# Altium footprint library capacitors.PcbLib: 59 footprints (part 1 of 4)
Each footprint in its own frame and in the unit in brackets; x right, y up, seen from the top. Pads: shape width x height; smd on the part's side, far side on the other; paste and mask are expansions set on the pad; w line width, h text height; cw(c..) or ccw(c..) is an arc to the next point about the centre after c.
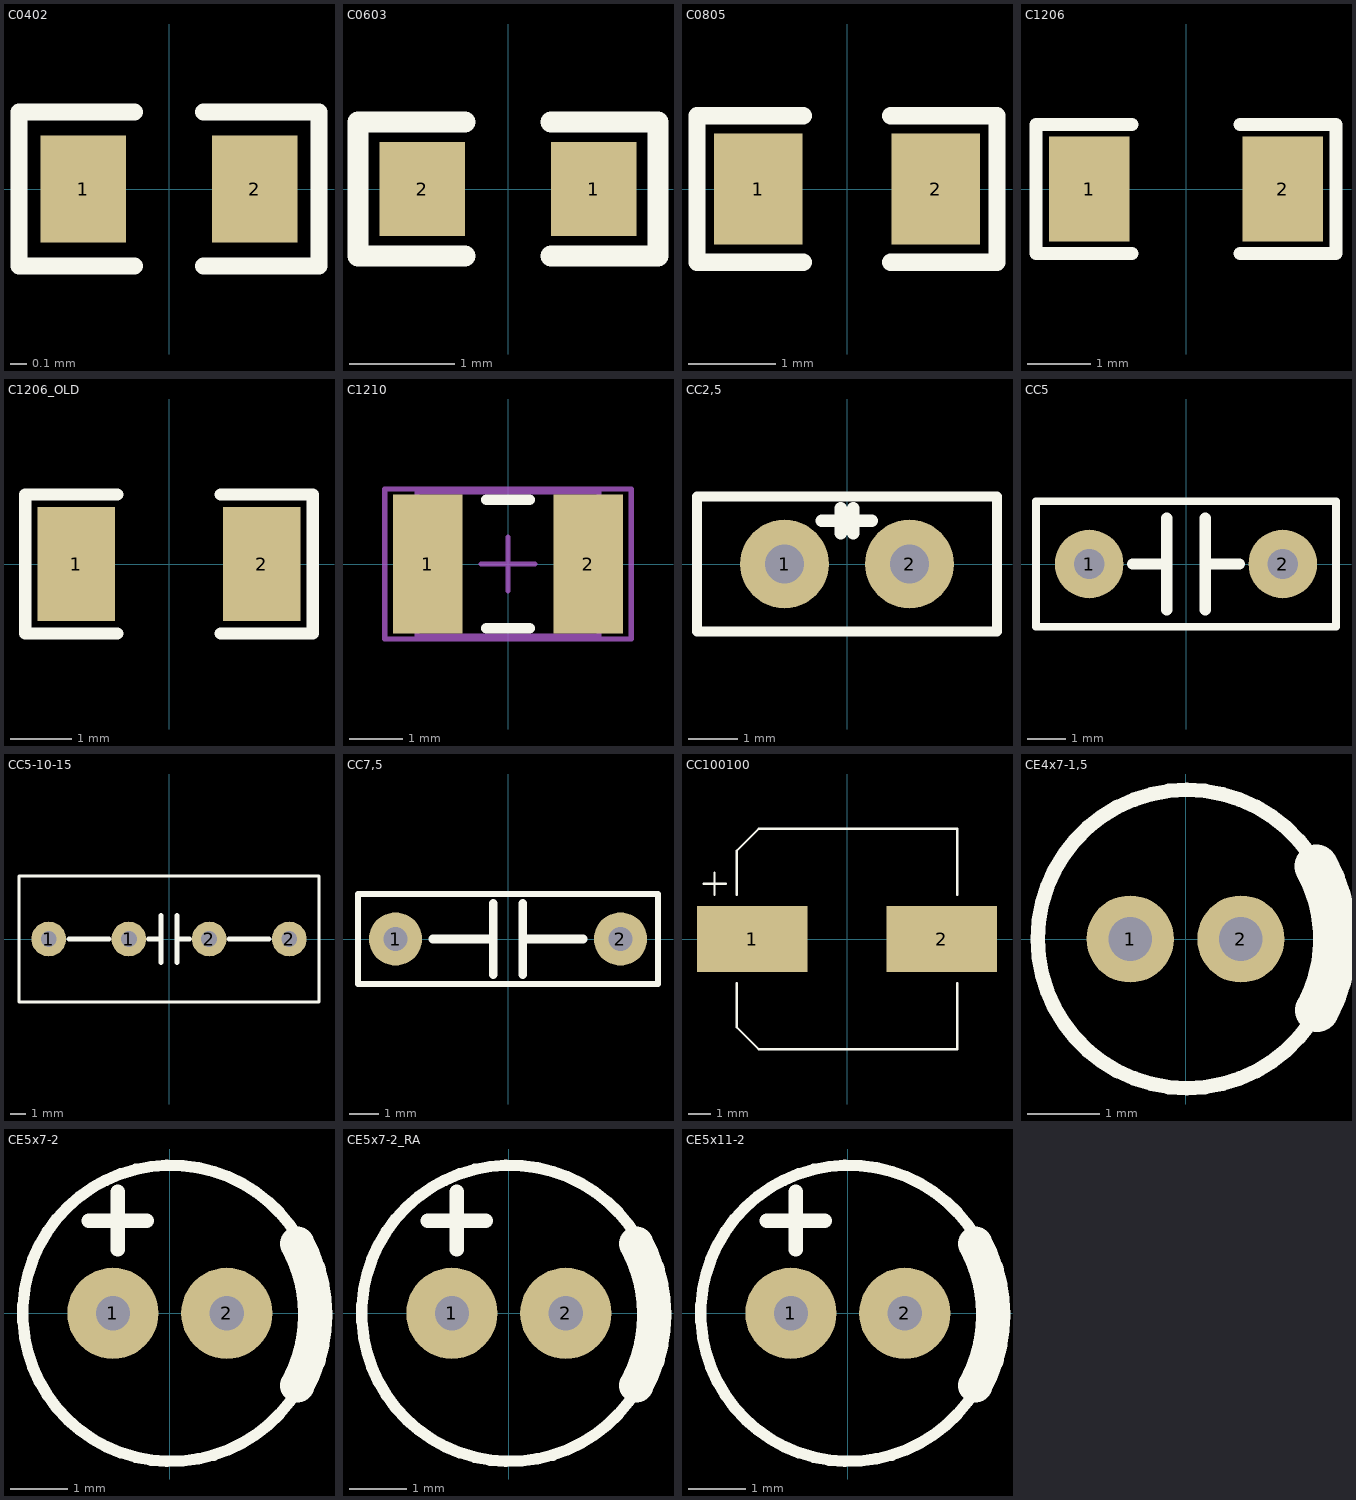
[diagram p0: the footprints below, top view; thin cyan lines are the x and y axes]

## C0402 [mil]
pads (2):
  rect 20x25 smd: 1(-20,0) 2(20,0)
Top Overlay:
  lines w3.94: -8,-18 -35,-18 -35,18 -8,18 ; 8,-18 35,-18 35,18 8,18
3D body "User Library-0402 SMD Capacitor.step": height 7.95, standoff 0, extent -19.68,-11.81 19.69,11.81

## C0603 [mil]
pads (2):
  rect 32x35 smd: 1(32,0) 2(-32,0)
Top Overlay:
  lines w7.87: -16,-25 -56,-25 -56,25 -16,25 ; 16,-25 56,-25 56,25 16,25
3D body "User Library-0603 SMD Capacitor.step": height 11.89, standoff 0, extent -31.49,-15.74 31.5,15.76

## C0805 [mil]
height 49.21
pads (2):
  rect 40x50 smd: 1(-40,0) 2(40,0)
Top Overlay:
  lines w7.87: -19.68,-33 -67.72,-33 -67.72,33 -19.68,33 ; 19.68,-33 67.72,-33 67.72,33 19.68,33
3D body "User Library-0805 SMD Capacitor.step": height 30.79, standoff 0, extent -39.36,-24.6 39.38,24.61

## C1206 [mil]
height 86.61
pads (2):
  rect 50x65 smd: 1(-60,0) 2(60,0)
Top Overlay:
  lines w7.87: -33.46,-40 -93,-40 -93,40 -33.46,40 ; 33.46,-40 92.91,-40 92.91,40 33.46,40
3D body "User Library-1206 SMD Capacitor.step": height 39.45, standoff 0, extent -62.99,-31.49 63,31.5

## C1206_OLD [mil]
height 86.61
pads (2):
  rect 50x74 smd: 1(-60,0) 2(60,0)
Top Overlay:
  lines w7.87: -33.46,-45 -93,-45 -93,45 -33.46,45 ; 33.46,-45 92.91,-45 92.91,45 33.46,45
3D body "User Library-1206 SMD Capacitor.step": height 39.45, standoff 0, extent -62.99,-31.49 63,31.5

## C1210 [mm] "Chip Capacitor, Body 3.2x2.5mm, IPC High Density"
height 1.3
pads (2):
  rect 1.3x2.6 smd: 1(-1.5,0) 2(1.5,0)
Top Overlay:
  lines w0.2: -0.4,-1.2 0.4,-1.2 ; -0.4,1.2 0.4,1.2
Mechanical 13:
  lines w0.1: -1.7,-1.35 -1.7,1.35 1.7,1.35 1.7,-1.35 -1.7,-1.35
Mechanical 15:
  lines w0.1: -0.5,0 0.5,0 ; 0,-0.5 0,0.5 ; -2.3,-1.4 -2.3,1.4 2.3,1.4 2.3,-1.4 -2.3,-1.4
3D body "User Library-CAPC3225X10.step": height 1, standoff 0, extent -1.6,-1.25 1.6,1.25

## C1812 [mm]
3D body "User Library-1812 SMD Capacitor.step": height 6.3, standoff 4.7, extent -2.692,-5.719 0.508,-1.219

## CC2,5 [mm]
pads (2):
  round 1.8 hole 0.8: 1(-1.27,0) 2(1.27,0)
Top Overlay:
  lines w0.2: -3.048,-1.372 3.048,-1.372 3.048,1.372 -3.048,1.372 -3.048,-1.372
  lines w0.254: -0.51,0.879 -0.256,0.879 ; -0.129,0.625 -0.129,1.133 ; 0.125,0.625 0.125,1.133 ; 0.125,0.879 0.379,0.879 0.506,0.879
3D body "SW3dPS-Cap 100n.STEP": height 6.22, standoff -1.7, extent -2.918,-0.848 2.921,0.848

## CC5 [mm]
height 5
pads (2):
  round 1.8 hole 0.8: 1(-2.54,0) 2(2.54,0)
Top Overlay:
  lines w0.2: -3.937,-1.651 -3.937,1.651 3.937,1.651 3.937,-1.651 -3.937,-1.651
  lines w0.3: -1.4,0 -0.5,0 ; -0.5,-1.2 -0.5,1.2 ; 0.5,-1.2 0.5,1.2 ; 0.5,0 1.4,0
3D body "SW3dPS-capacitor-radial.STEP": height 6.35, standoff -1.27, extent -2.794,-1.194 2.794,1.092

## CC5-10-15 [mm]
height 10
pads (4):
  round 2.2 hole 1: 1(-7.62,0) 1(-2.54,0) 2(2.54,0) 2(7.62,0)
Top Overlay:
  lines w0.2: -9.5,-4 9.5,-4 9.5,4 -9.5,4 -9.5,-4
  lines w0.3: -6.35,0 -3.8,0 ; -1.3,0 -0.5,0 ; -0.5,-1.5 -0.5,1.5 ; 0.5,-1.5 0.5,1.5 ; 0.5,0 1.3,0 ; 3.8,0 6.35,0

## CC7,5 [mm]
height 5
pads (2):
  round 1.8 hole 0.8: 1(-3.81,0) 2(3.81,0)
Top Overlay:
  lines w0.2: -5.08,-1.524 5.08,-1.524 5.08,1.524 -5.08,1.524 -5.08,-1.524
  lines w0.3: -2.54,0 -0.5,0 ; -0.5,-1.2 -0.5,1.2 ; 0.5,-1.2 0.5,1.2 ; 0.5,0 2.54,0
3D body "SW3dPS-ceramic 7,5 mm.STEP": height 9.03, standoff -4.16, extent -4,-1.198 4.001,1.195

## CC100100 [mm] "SMD Electrolytic Capacitor 10 x 10 mm"
height 10.8
pads (2):
  rect 5x3 smd: 1(-4.3,0) 2(4.3,0)
Top Overlay:
  lines w0.1: -6.5,2.5 -5.5,2.5 ; -6,2 -6,3 ; -5,-2 -5,-4 -4,-5 5,-5 ; -5,2 -5,4 -4,5 5,5 5,2 ; 5,-2 5,-5 ; 5,-5 5,-5

## CE4x7-1,5 [mm] "Aluminium Electrolytic Capacitor -  Radius: 4mm, Height: 7mm, PinSpacing: 2mm"
height 7.5
pads (2):
  round 1.2 hole 0.6: 1(-0.762,0) 2(0.762,0)
Top Overlay:
  circle w0.2: c0.018,0 r2.052
  lines w0.6: 1.798,0.999 cw(c0,0) 1.809,-0.98
3D body "User Library-Cap 4x7.STEP": height 7.1, standoff -1.9, extent -1.975,-2.007 2.025,1.993

## CE5x7-2 [mm] "Aluminium Electrolytic Capacitor -  Radius: 5mm, Height: 7mm, PinSpacing: 2mm"
height 7
pads (2):
  round 1.6 hole 0.6: 1(-1,0) 2(1,0)
Top Overlay:
  circle w0.2: c0.018,0 r2.6
  lines w0.25: -1.422,1.626 -0.406,1.626 ; -0.914,1.118 -0.914,2.134
  lines w0.6: 2.235,-1.27 ccw(c-0.047,-0.025) 2.235,1.22
3D body "User Library-Cap electro 5x7x2mm.STEP": height 7.33, standoff -2.2, extent -2.5,-2.525 2.551,2.525

## CE5x7-2_RA [mm] "Aluminium Electrolytic Capacitor -  Radius: 5mm, Height: 7mm, PinSpacing: 2mm, Right Angle"
height 3.5
pads (2):
  round 1.6 hole 0.6: 1(-1,0) 2(1,0)
Top Overlay:
  circle w0.2: c0.018,0 r2.6
  lines w0.25: -1.422,1.626 -0.406,1.626 ; -0.914,1.118 -0.914,2.134
  lines w0.6: 2.235,-1.27 ccw(c-0.047,-0.025) 2.235,1.22
3D body "User Library-Cap electro 5x7x2mm RA.STEP": height 5.03, standoff -1.5, extent -2.525,-0.3 2.525,9.021

## CE5x11-2 [mm] "Aluminium Electrolytic Capacitor -  Radius: 5mm, Height: 11mm, PinSpacing: 2mm"
height 11
pads (2):
  round 1.6 hole 0.6: 1(-1,0) 2(1,0)
Top Overlay:
  circle w0.2: c0.018,0 r2.6
  lines w0.25: -1.422,1.626 -0.406,1.626 ; -0.914,1.118 -0.914,2.134
  lines w0.6: 2.235,-1.27 ccw(c-0.047,-0.025) 2.235,1.22
3D body "User Library-Cap electro 5x11x2mm.STEP": height 11.33, standoff -2.2, extent -2.551,-2.525 2.5,2.525